# Altium integrated library RCL_lib.IntLib: 34 symbols
Pins are listed as number, name and electrical type; pins without a type are passive.

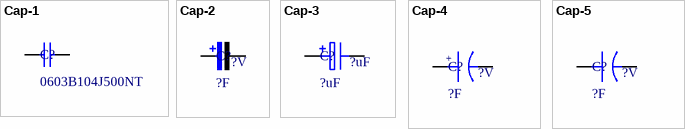
[diagram p0: symbols Cap-1 to Cap-5]

## Cap-1
designator C?, comment 0603B104J500NT
多层片式陶瓷电容器; 厂家: 风华电子; 版本: 2015-V1.0; 价格: 0.01; Value: ?F; 品名: 贴片电容; 精度: 10%
footprint C-RAD-0402
footprint C-RAD-0603
footprint C-RAD-0805
footprint C-RAD-1812
footprint C-RAD-1825
footprint C0402
footprint C0603
footprint C0805
footprint C1206
footprint 1210
footprint 1810
footprint 1812
pins: 1, 2

## Cap-2
designator C?, comment ?F  MAX-Voltage: ?V
贴片钽电容; 厂家: 风华电子; 版本: 2015-V1.0; 价格: 0.01; 品名: 钽电容; 精度: 5%; Value: ?F
footprint CAP-3216_A (钽电容)
footprint CAP-3528_B (钽电容)
footprint CAP-6032_C (钽电容)
footprint CAP-7343_D (钽电容)
footprint 3216
footprint 3528
footprint 6032
footprint 7343
pins: 1, 2

## Cap-3
designator C?, comment ?uF
贴片型电解电容; 厂家: 风华电子; 版本: 2015-V1.0; 价格: 0.01; 品名: 钽电容; 精度: 5%; Value: ?uF
footprint C-RB-S6 (贴片电解)
footprint C-RB-S8 (贴片电解)
footprint C-RB-S10 (贴片电解)
footprint ED4
footprint ED5
footprint ED6_3
footprint ED8
footprint ED10
footprint ED13
pins: 1, 2 E

## Cap-4
designator C?, comment ?F  MAX-Voltage: ?V
焊片型电解电容; 厂家: 风华电子; 版本: 2015-V1.0; 价格: 0.01; 品名: 钽电容; 精度: 5%; Value: ?F
footprint C-RB-8 (直插电解电容)
footprint C-RB-10 (直插电解电容)
footprint C-RB-12 (直插电解电容)
footprint C-RB-18 (直插电解电容)
footprint RB.1/.2
footprint RB.1/.22
pins: 1, 2
text: +

## Cap-5
designator C?, comment ?F  MAX-Voltage: ?V
CBB电解电容; 厂家: 风华电子; 版本: 2015-V1.0; 价格: 0.01; 品名: 钽电容; 精度: 5%; Value: ?F
footprint RAD-0.2-CBB
footprint RAD-0.2-CBB1
footprint C105J63
pins: 1, 2


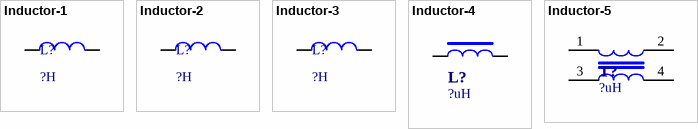
[diagram p1: symbols Inductor-1 to Inductor-5]

## Inductor-1
designator L?, comment ?H
贴片式层叠电感; 厂家: 国巨电子; 版本: 2015-V1.0; 价格: 0.01; Value: ?H
footprint L0603
footprint L0805
footprint L1206
footprint L453226
pins: 1, 2

## Inductor-2
designator L?, comment ?H
直插立式固定电感; 厂家: 国巨电子; 版本: 2015-V1.0; 价格: 0.01; Value: ?H
footprint L-RB-8 (Inductor)
footprint L-RB-8F (ֱ?)
pins: 1, 2

## Inductor-3
designator L?, comment ?H
贴片屏蔽式功率电感; 厂家: 国巨电子; 版本: 2015-V1.0; 价格: 0.01; Value: ?H
footprint L-1812
footprint L-CD104
footprint L-CD127
footprint L-SMD-7 (贴片电感7*7)
footprint L-SMD-10 (贴片电感10*10)
footprint L-SMD-12 (贴片电感12*12)
pins: 1, 2

## Inductor-4
designator L?, comment ?uH
含铁芯电感
pins: 1, 2

## Inductor-5
designator T?, comment ?uH
共模电感
footprint B82793C0
pins: 1, 2, 3, 4


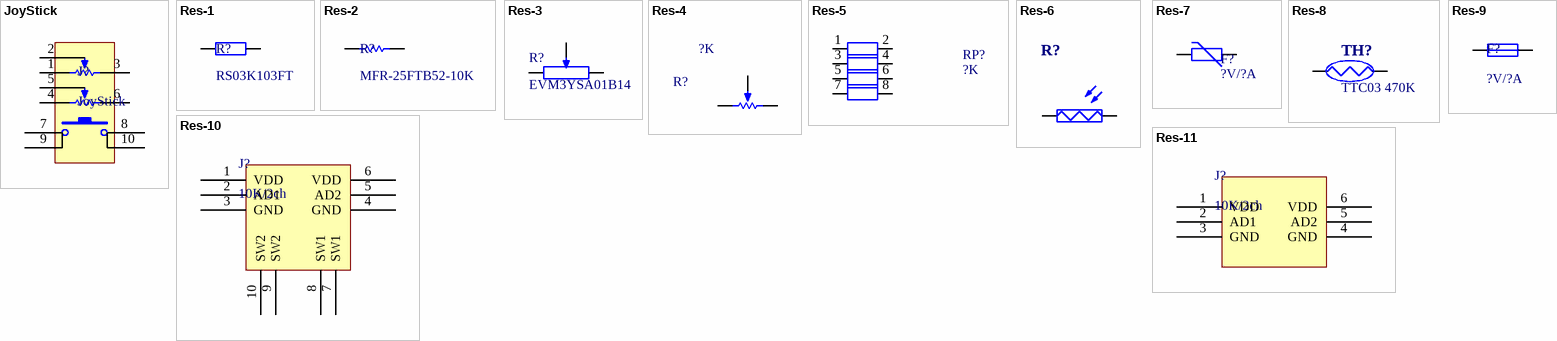
[diagram p2: symbols JoyStick to Res-11]

## JoyStick
designator J?
模拟摇杆
footprint JoyStick (模拟摇杆)
pins: 1 BOT, 2 TAP, 3 TOP, 4 BOT, 5 TAP, 6 TOP, 7, 8, 9, 10

## Res-1
designator R?, comment RS03K103FT
厚膜片式固定电阻器; 厂家: 风华高科; 版本: 2015-V1.0; 价格: 0.01; Value: ?K; 品名: 贴片电阻; 精度: 5%
footprint RES-0402
footprint RES-0603
footprint RES-0805
footprint RES-1206
footprint RES-2512
pins: 1, 2

## Res-2
designator R?, comment MFR-25FTB52-10K
金属膜导线电阻器; 厂家: 国巨电子; 版本: 2015-V1.0; 价格: 0.01; Value: ?K; 品名: 贴片电阻; 精度: 5%
footprint 1/4WA1
footprint 1/8WA
footprint 1/8WL
footprint AXAL-0_5-R
footprint AXIAL0_4
footprint AXIAL0_4_1
footprint AXIAL0_4_2
footprint AXIAL-0.3
footprint AXIAL-12.7*4MM
footprint AXIAL-20*5MM-W (2W电阻)
footprint AXIAL-22*6.6MM-W (2W电阻)
pins: 1, 2

## Res-3
designator R?, comment EVM3YSA01B14
片式微调电位器
footprint 3314J
footprint 3324W
pins: 1, 2, 3

## Res-4
designator R?, comment ?K
直插可调电位器; Value: ?K
footprint VR_A1 (Potentiometer; 3 Leads)
footprint VR_B1 (Potentiometer; 3 Leads)
footprint VR_B50K_S
footprint VR_3296
footprint VR_3296W
footprint VR_3362
pins: 1 TOP, 2 TAP, 3 BOT
1 alternate drawing of the same symbol

## Res-5
designator RP?, comment ?K
贴片排阻
footprint RP4-0603
footprint RP4-0603-2
footprint RP4_0603P
footprint RP4-0603-1
pins: 1, 2, 3, 4, 5, 6, 7, 8

## Res-6
designator R?
光敏电阻
pins: 1, 2

## Res-7
designator F?, comment ?V/?A
压敏电阻
footprint ZOV (压敏电阻)
footprint 10D471K
footprint 10k471
pins: 1, 2

## Res-8
designator TH?, comment TTC03 470K
热敏电阻
footprint NTC (热敏电阻)
footprint NTC-5D-9
pins: 1, 2

## Res-9
designator F?, comment ?V/?A
可熔断保险，保险丝、保险管类表示
footprint Fuse_M
footprint FUSE
footprint FUSE-14MM
footprint FUSE-15MM
footprint FUSE-17.78MM
footprint FUSE-30MM
footprint FUSE-L
footprint FUSE-15A
pins: 1, 2

## Res-10
designator J?, comment 10K/2ch
摇杆电位器,带按键
footprint YAOGAN_ANJIAN
pins: 1 VDD, 2 AD1, 3 GND, 4 GND, 5 AD2, 6 VDD, 7 SW1, 8 SW1, 9 SW2, 10 SW2

## Res-11
designator J?, comment 10K/2ch
摇杆电位器,不带按键
footprint YAOGAN
pins: 1 VDD, 2 AD1, 3 GND, 4 GND, 5 AD2, 6 VDD


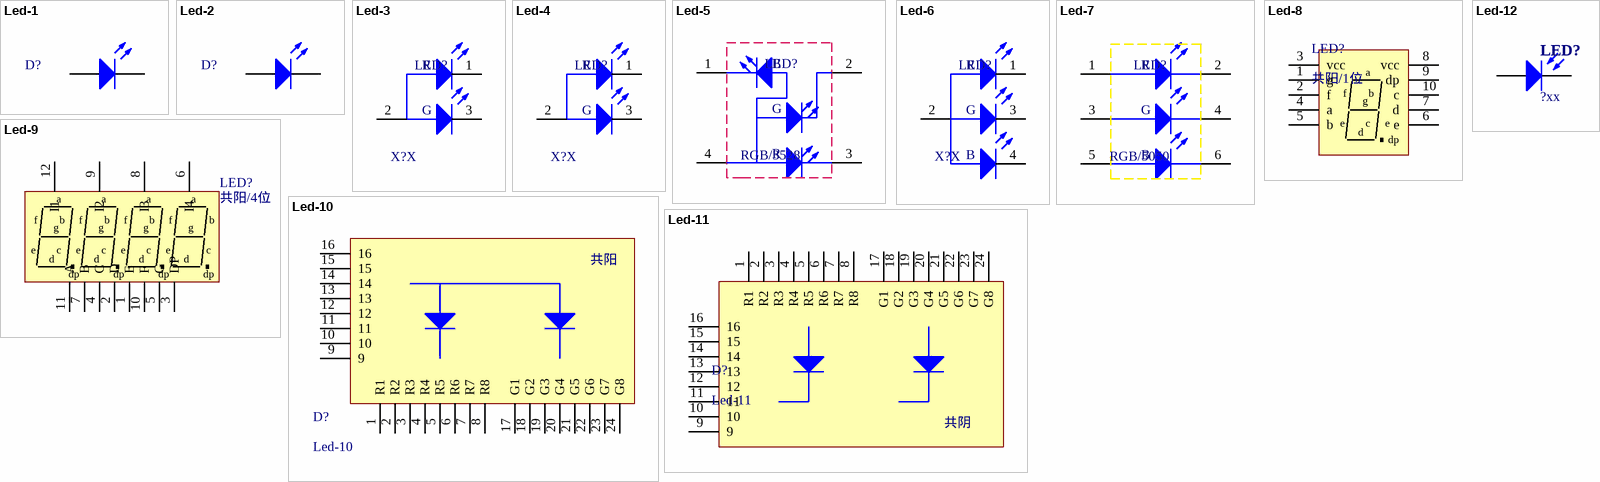
[diagram p3: symbols Led-1 to Led-12]

## Led-1
designator D?, comment g  (value not drawn)
贴片单色发光二极管; 价格: 0.01; 版本: 2015-V1.0; 厂家: *; Value: g
footprint LED-0603
footprint LED-0805
footprint LED-1206 (贴片发光二极管)
pins: 1 A, 2 K

## Led-2
designator D?, comment g  (value not drawn)
直插单色发光二极管; 价格: 0.01; 版本: 2015-V1.0; 厂家: *; Value: g
footprint LED3
footprint LED5
footprint LED-3-G
footprint LED-3-R
footprint LED-3-Y
footprint LED_1 (LED; 2 Leads)
footprint LED_2 (LED; 2 Leads)
footprint LED_5MM
footprint LED_A1 (直径3MM二极管)
footprint LED_A2 (直径3MM二极管)
pins: 1 A, 2 K

## Led-3
designator LED?, comment X?X
贴片双色发光二极管
pins: 1, 2, 3
text: R; G

## Led-4
designator LED?, comment X?X
直插双色发光二极管
pins: 1, 2, 3
text: R; G

## Led-5
designator LED?, comment RGB/3528
4脚贴片三色发光二极管（3528）
footprint LED3258
pins: 1, 2, 3, 4
text: B; G; R

## Led-6
designator LED?, comment X?X
4脚直插三色发光二极管（F5）
footprint LED-RGB (三基色二极管)
pins: 1, 2, 3, 4
text: R; G; B

## Led-7
designator LED?, comment RGB/5050
6脚贴片三色发光二极管（5050）
footprint 5050
pins: 1, 2, 3, 4, 5, 6
text: R; G; B

## Led-8
designator LED?, comment 共阳/1位
共阳一段数码管
footprint LED_DIG2
pins: 1 g, 2 f, 3 vcc, 4 a, 5 b, 6 e, 7 d, 8 vcc, 9 dp, 10 c

## Led-9
designator LED?, comment 共阳/4位
共阳四位数码管
footprint SHUMA_DIP12
pins: 1 E, 2 D, 3 DP, 4 C, 5 G, 6 I4, 7 B, 8 I3, 9 I2, 10 F, 11 A, 12 I1
text: a; f; b; g; e; c; d; dp

## Led-10
designator D?
1.9mm点阵模块_共阳
footprint KYX_788
footprint KYX_788_22x22
pins: 1 R1, 2 R2, 3 R3, 4 R4, 5 R5, 6 R6, 7 R7, 8 R8, 9, 10, 11, 12, 13, 14, 15, 16, 17 G1, 18 G2, 19 G3, 20 G4, 21 G5, 22 G6, 23 G7, 24 G8
text: 共阳

## Led-11
designator D?
1.9mm点阵模块_共阴
footprint KYX_788
pins: 1 R1, 2 R2, 3 R3, 4 R4, 5 R5, 6 R6, 7 R7, 8 R8, 9, 10, 11, 12, 13, 14, 15, 16, 17 G1, 18 G2, 19 G3, 20 G4, 21 G5, 22 G6, 23 G7, 24 G8
text: 共阴

## Led-12
designator LED?, comment ?xx
光电二极管，光敏二极管
pins: 1 A, 2 K